# Altium schematic symbol library IC_TI.SCHLIB: 1162 symbols (part 3 of 8)
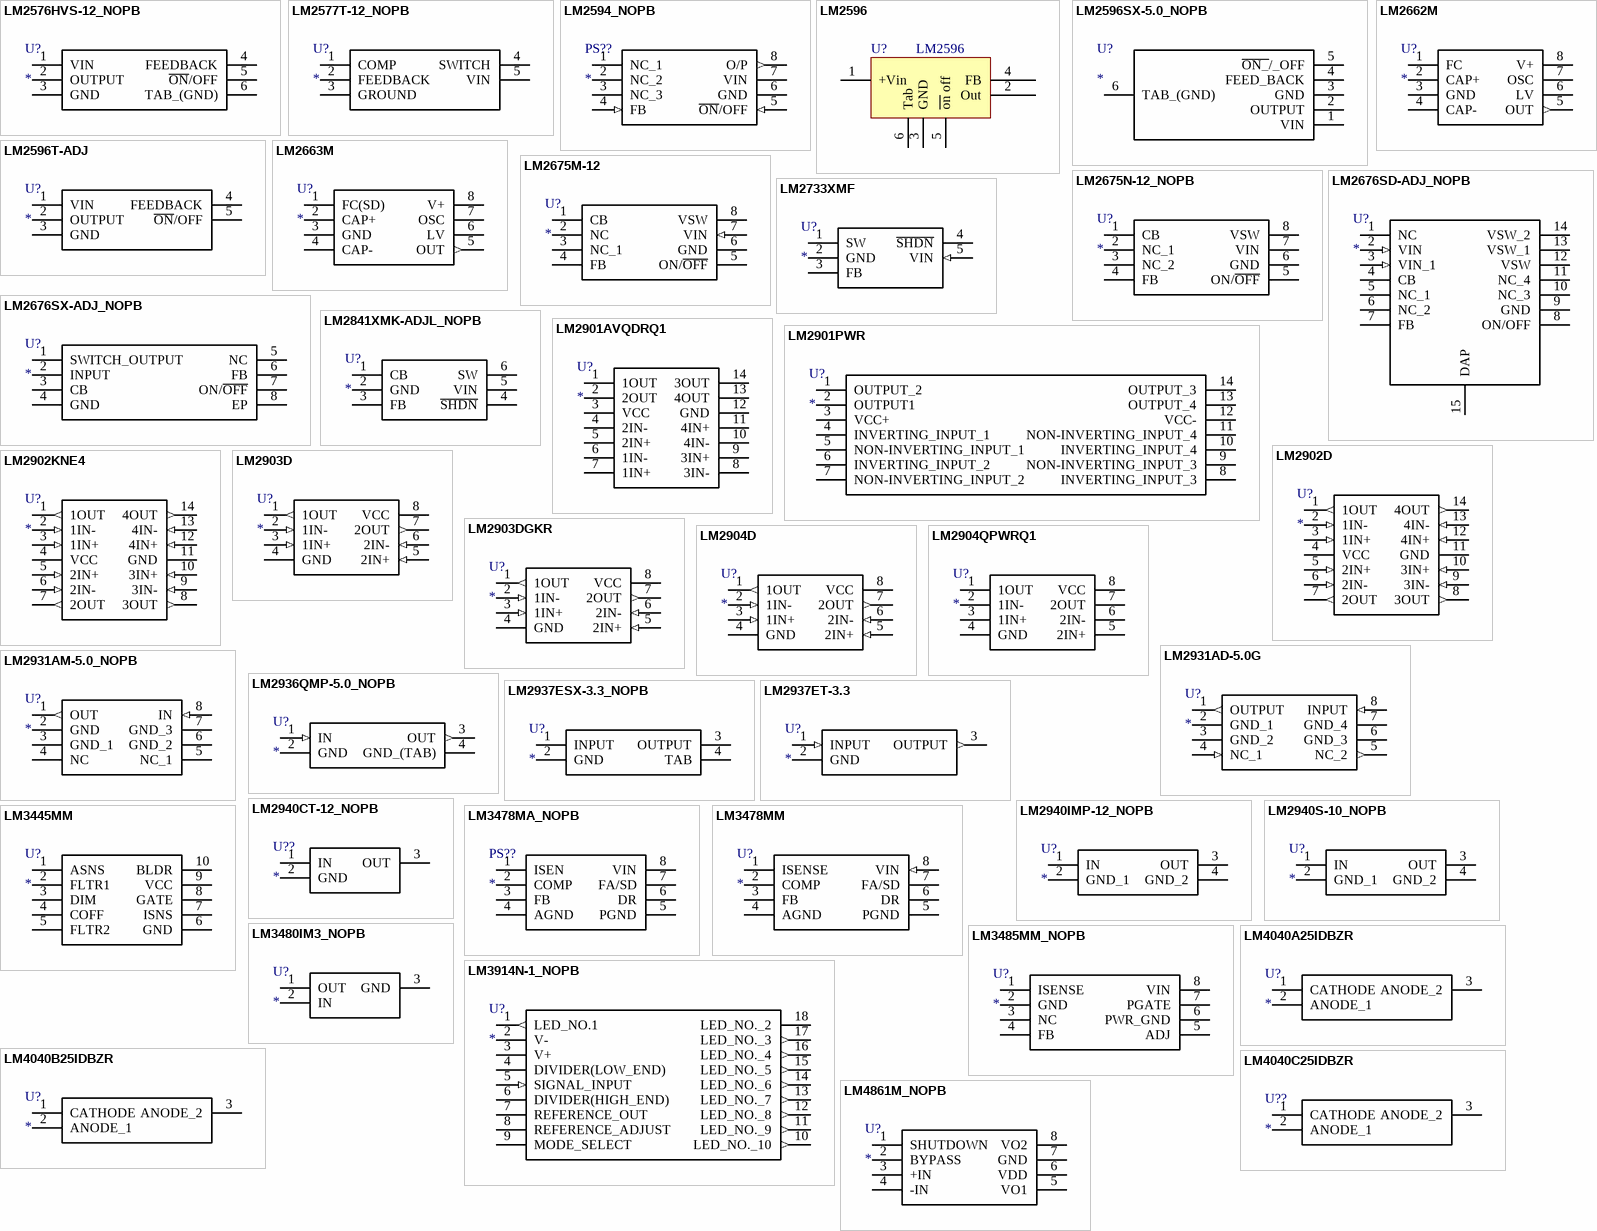
[diagram p37: symbols LM2576HVS-12_NOPB to LM4861M_NOPB]

## LM2902D
designator U?
Integrated Circuit; Manufacturer_Name: Texas Instruments; Manufacturer_Part_Number: LM2902D; Datasheet Link: http://www.ti.com/lit/ds/symlink/lm2902.pdf; Height: 1.75mm; Mouser Part Number: 595-LM2902D; Mouser Price/Stock: https://www.mouser.com/Search/Refine.aspx?Keyword=595-LM2902D; RS Part Number: 1450086; RS Price/Stock: http://uk.rs-online.com/web/p/products/1450086
footprint SOIC14_1.27
pins: 1 1OUT (out), 2 1IN- (in), 3 1IN+ (in), 4 VCC (power), 5 2IN+ (in), 6 2IN- (in), 7 2OUT (out), 8 3OUT (out), 9 3IN- (in), 10 3IN+ (in), 11 GND (power), 12 4IN+ (in), 13 4IN- (in), 14 4OUT (out)

## LM2902KNE4
designator U?
Integrated Circuit; Manufacturer_Name: Texas Instruments; Manufacturer_Part_Number: LM2902KNE4; Datasheet Link: http://www.ti.com/lit/ds/symlink/lm224.pdf; Height: 5.08mm; RS Part Number: 7320982; RS Price/Stock: http://uk.rs-online.com/web/p/products/7320982
footprint DIP14-A
pins: 1 1OUT (out), 2 1IN- (in), 3 1IN+ (in), 4 VCC (power), 5 2IN+ (in), 6 2IN- (in), 7 2OUT (out), 8 3OUT (out), 9 3IN- (in), 10 3IN+ (in), 11 GND (power), 12 4IN+ (in), 13 4IN- (in), 14 4OUT (out)

## LM2903D
designator U?
Integrated Circuit; Manufacturer_Name: Texas Instruments; Manufacturer_Part_Number: LM2903D; Datasheet Link: http://www.ti.com/lit/ds/symlink/lm2903.pdf; Height: 1.75mm; Mouser Part Number: 595-LM2903D; Mouser Price/Stock: https://www.mouser.com/Search/Refine.aspx?Keyword=595-LM2903D; RS Part Number: 6612794P; RS Price/Stock: http://uk.rs-online.com/web/p/products/6612794P
footprint SOIC8_1.27 (SOP, 8-Leads, Pitch 1.27mm)
pins: 1 1OUT (out), 2 1IN- (in), 3 1IN+ (in), 4 GND (power), 5 2IN+ (in), 6 2IN- (in), 7 2OUT (out), 8 VCC (power)

## LM2903DGKR
designator U?
Integrated Circuit; Manufacturer_Name: Texas Instruments; Manufacturer_Part_Number: LM2903DGKR; Datasheet Link: http://www.ti.com/lit/ds/symlink/lm393.pdf; Height: 1.1mm; Mouser Part Number: 595-LM2903DGKR; Mouser Price/Stock: https://www.mouser.com/Search/Refine.aspx?Keyword=595-LM2903DGKR; RS Part Number: 1625376; RS Price/Stock: http://uk.rs-online.com/web/p/products/1625376
footprint VSSOP8_0.65-PAD
pins: 1 1OUT (out), 2 1IN- (in), 3 1IN+ (in), 4 GND (power), 5 2IN+ (in), 6 2IN- (in), 7 2OUT (out), 8 VCC (power)

## LM2904D
designator U?
Integrated Circuit; Manufacturer_Name: Texas Instruments; Manufacturer_Part_Number: LM2904D; Datasheet Link: http://www.ti.com/lit/ds/symlink/lm2904.pdf; Height: 1.75mm; Mouser Part Number: 595-LM2904D; Mouser Price/Stock: https://www.mouser.com/Search/Refine.aspx?Keyword=595-LM2904D; RS Part Number: 1450108; RS Price/Stock: http://uk.rs-online.com/web/p/products/1450108
footprint SOIC8_1.27 (SOP, 8-Leads, Pitch 1.27mm)
pins: 1 1OUT (out), 2 1IN- (in), 3 1IN+ (in), 4 GND (power), 5 2IN+ (in), 6 2IN- (in), 7 2OUT (out), 8 VCC (power)

## LM2904QPWRQ1
designator U?
Integrated Circuit; Manufacturer_Name: Texas Instruments; Manufacturer_Part_Number: LM2904QPWRQ1; Datasheet Link: http://www.mouser.com/ds/2/405/lm2904-q1-557148.pdf; Height: 1.2mm; Mouser Part Number: 595-LM2904QPWRQ1; Mouser Price/Stock: https://www.mouser.com/Search/Refine.aspx?Keyword=595-LM2904QPWRQ1
footprint TSSOP8_0.65
pins: 1 1OUT, 2 1IN-, 3 1IN+, 4 GND, 5 2IN+, 6 2IN-, 7 2OUT, 8 VCC

## LM2931AD-5.0G
designator U?
Integrated Circuit; Manufacturer_Name: ON Semiconductor; Manufacturer_Part_Number: LM2931AD-5.0G; Allied_Number: 70100430; Datasheet Link: http://www.onsemi.com/pub/Collateral/LM2931-D.PDF; Height: 1.75mm; Mouser Part Number: 863-LM2931AD-5.0G; Mouser Price/Stock: https://www.mouser.com/Search/Refine.aspx?Keyword=863-LM2931AD-5.0G; RS Part Number: 0463470P; RS Price/Stock: http://uk.rs-online.com/web/p/products/0463470P; Allied Price/Stock: http://www.alliedelec.com/on-semiconductor-lm2931ad-5-0g/70100430/
footprint SOIC8_1.27 (SOP, 8-Leads, Pitch 1.27mm)
pins: 1 OUTPUT (out), 2 GND_1 (power), 3 GND_2 (power), 4 NC_1 (in), 5 NC_2 (out), 6 GND_3 (power), 7 GND_4 (power), 8 INPUT (in)

## LM2931AM-5.0_NOPB
designator U?
Integrated Circuit; Manufacturer_Name: Texas Instruments; Manufacturer_Part_Number: LM2931AM-5.0/NOPB; Datasheet Link: http://www.ti.com/lit/ds/symlink/lm2931-n.pdf; Height: 1.75mm; Mouser Part Number: 926-LM2931AM-5.0NOPB; Mouser Price/Stock: https://www.mouser.com/Search/Refine.aspx?Keyword=926-LM2931AM-5.0NOPB; RS Part Number: 0460869; RS Price/Stock: http://au.rs-online.com/web/p/products/0460869
footprint SOIC8_1.27 (SOP, 8-Leads, Pitch 1.27mm)
pins: 1 OUT (out), 2 GND (power), 3 GND_1 (power), 4 NC, 5 NC_1, 6 GND_2 (power), 7 GND_3 (power), 8 IN (in)

## LM2936QMP-5.0_NOPB
designator U?
Integrated Circuit; Manufacturer_Name: Texas Instruments; Manufacturer_Part_Number: LM2936QMP-5.0/NOPB; Datasheet Link: http://www.ti.com/general/docs/lit/getliterature.tsp?genericPartNumber=lm2936q-q1&fileType=pdf; Height: 1.8mm; Mouser Part Number: 595-LM2936QMP-5.0NPB; Mouser Price/Stock: https://www.mouser.com/Search/Refine.aspx?Keyword=595-LM2936QMP-5.0NPB
footprint SOT223
pins: 1 IN (in), 2 GND (power), 3 OUT (out), 4 GND_(TAB) (power)

## LM2937ESX-3.3_NOPB
designator U?
Integrated Circuit; Manufacturer_Name: Texas Instruments; Manufacturer_Part_Number: LM2937ESX-3.3/NOPB; Datasheet Link: http://www.ti.com/lit/gpn/lm2937-3.3; Mouser Part Number: 926-LM2937ESX33NOPB; Mouser Price/Stock: https://www.mouser.com/Search/Refine.aspx?Keyword=926-LM2937ESX33NOPB
footprint TO263-3
pins: 1 INPUT, 2 GND, 3 OUTPUT, 4 TAB

## LM2937ET-3.3
designator U?
Integrated Circuit; Manufacturer_Name: Texas Instruments; Manufacturer_Part_Number: LM2937ET-3.3; Datasheet Link: https://componentsearchengine.com/Datasheets/2/LM2937ET-3.3.pdf; Height: 4.7mm; Mouser Part Number: 926-LM2937ET-33; Mouser Price/Stock: https://www.mouser.com/Search/Refine.aspx?Keyword=926-LM2937ET-33; RS Part Number: 4713766; RS Price/Stock: http://uk.rs-online.com/web/p/products/4713766
footprint TO220-3
pins: 1 INPUT (in), 2 GND (power), 3 OUTPUT (out)

## LM2940CT-12_NOPB
designator U??
Undefined or Miscellaneous; Manufacturer_Name: Texas Instruments; Manufacturer_Part_Number: LM2940CT-12/NOPB; Datasheet Link: http://www.ti.com/lit/gpn/lm2940c; Height: 4.7mm; Mouser Part Number: 926-LM2940CT-12/NOPB; Mouser Price/Stock: https://www.mouser.com/Search/Refine.aspx?Keyword=926-LM2940CT-12%2FNOPB; RS Part Number: 5359290; RS Price/Stock: http://uk.rs-online.com/web/p/products/5359290
footprint TO220-3
pins: 1 IN, 2 GND, 3 OUT

## LM2940IMP-12_NOPB
designator U?
Integrated Circuit; Manufacturer_Name: Texas Instruments; Manufacturer_Part_Number: LM2940IMP-12/NOPB; Datasheet Link: http://www.mouser.com/ds/2/405/lm2940-n-405274.pdf; Height: 1.8mm; Mouser Part Number: 926-LM2940IMP-12NOPB; Mouser Price/Stock: https://www.mouser.com/Search/Refine.aspx?Keyword=926-LM2940IMP-12NOPB; RS Part Number: 7614609P; RS Price/Stock: http://uk.rs-online.com/web/p/products/7614609P
footprint SOT223
pins: 1 IN, 2 GND_1, 3 OUT, 4 GND_2

## LM2940S-10_NOPB
designator U?
Integrated Circuit; Manufacturer_Name: Texas Instruments; Manufacturer_Part_Number: LM2940S-10/NOPB; Datasheet Link: http://www.ti.com/lit/gpn/lm2940-n; Mouser Part Number: 926-LM2940S-10/NOPB; Mouser Price/Stock: https://www.mouser.com/Search/Refine.aspx?Keyword=926-LM2940S-10%2FNOPB; RS Part Number: 1451304; RS Price/Stock: http://uk.rs-online.com/web/p/products/1451304
footprint TO263-3
pins: 1 IN, 2 GND_1, 3 OUT, 4 GND_2

## LM3445MM
designator U?
Integrated Circuit; Manufacturer_Name: Texas Instruments; Manufacturer_Part_Number: LM3445MM
footprint VSSOP10_0.5
pins: 1 ASNS, 2 FLTR1, 3 DIM, 4 COFF, 5 FLTR2, 6 GND, 7 ISNS, 8 GATE, 9 VCC, 10 BLDR

## LM3478MA_NOPB
designator PS??
Power Supply; Manufacturer_Name: Texas Instruments; Manufacturer_Part_Number: LM3478MA/NOPB; Datasheet Link: http://www.ti.com/lit/gpn/lm3478; Height: 1.75mm; Mouser Part Number: 926-LM3478MA/NOPB; Mouser Price/Stock: https://www.mouser.com/Search/Refine.aspx?Keyword=926-LM3478MA%2FNOPB; RS Part Number: 8115560P; RS Price/Stock: http://uk.rs-online.com/web/p/products/8115560P
footprint SOIC8_1.27 (SOP, 8-Leads, Pitch 1.27mm)
pins: 1 ISEN, 2 COMP, 3 FB, 4 AGND, 5 PGND, 6 DR, 7 FA/SD, 8 VIN

## LM3478MM
designator U?
Integrated Circuit; Manufacturer_Name: Texas Instruments; Manufacturer_Part_Number: LM3478MM; Datasheet Link: http://www.ti.com/lit/ds/symlink/lm3478.pdf; Height: 1.1mm; Mouser Part Number: 926-LM3478MM; Mouser Price/Stock: https://www.mouser.com/Search/Refine.aspx?Keyword=926-LM3478MM; RS Part Number: 4713930; RS Price/Stock: http://uk.rs-online.com/web/p/products/4713930
footprint VSSOP8_0.65-PAD
pins: 1 ISENSE, 2 COMP, 3 FB, 4 AGND (power), 5 PGND (power), 6 DR, 7 FA/SD, 8 VIN (in)

## LM3480IM3_NOPB
designator U?
Integrated Circuit; Manufacturer_Name: Texas Instruments; Manufacturer_Part_Number: LM3480IM3-5.0/NOPB; Datasheet Link: http://www.ti.com/lit/gpn/lm3480; Height: 0.95mm; Mouser Part Number: 926-LM3480IM35.0NOPB; Mouser Price/Stock: https://www.mouser.com/Search/Refine.aspx?Keyword=926-LM3480IM35.0NOPB; RS Part Number: 5045115P; RS Price/Stock: http://uk.rs-online.com/web/p/products/5045115P
footprint SOT23-3 (贴片MOS的SOT-23封装)
pins: 1 OUT, 2 IN, 3 GND

## LM3485MM_NOPB
designator U?
Integrated Circuit; Manufacturer_Name: Texas Instruments; Manufacturer_Part_Number: LM3485MM/NOPB; Datasheet Link: http://www.ti.com/lit/ds/symlink/lm3485.pdf; Height: 1.1mm; Mouser Part Number: 926-LM3485MM/NOPB; Mouser Price/Stock: https://www.mouser.com/Search/Refine.aspx?Keyword=926-LM3485MM%2FNOPB; RS Part Number: 5359391P; RS Price/Stock: http://uk.rs-online.com/web/p/products/5359391P
footprint VSSOP8_0.65-PAD
pins: 1 ISENSE, 2 GND, 3 NC, 4 FB, 5 ADJ, 6 PWR_GND, 7 PGATE, 8 VIN

## LM3914N-1_NOPB
designator U?
Integrated Circuit; Manufacturer_Name: Texas Instruments; Manufacturer_Part_Number: LM3914N-1/NOPB; Datasheet Link: https://componentsearchengine.com/Datasheets/2/LM3914N-1_NOPB.pdf; Height: 5.334mm; Mouser Part Number: 926-LM3914N-1/NOPB; Mouser Price/Stock: https://www.mouser.com/Search/Refine.aspx?Keyword=926-LM3914N-1%2FNOPB; RS Part Number: 5342977A; RS Price/Stock: http://uk.rs-online.com/web/p/products/5342977A
footprint DIP18-A
pins: 1 LED_NO.1 (out), 2 V- (power), 3 V+ (power), 4 DIVIDER(LOW_END), 5 SIGNAL_INPUT (in), 6 DIVIDER(HIGH_END), 7 REFERENCE_OUT, 8 REFERENCE_ADJUST, 9 MODE_SELECT, 10 LED_NO._10 (out), 11 LED_NO._9 (out), 12 LED_NO._8 (out), 13 LED_NO._7 (out), 14 LED_NO._6 (out), 15 LED_NO._5 (out), 16 LED_NO._4 (out), 17 LED_NO._3 (out), 18 LED_NO._2

## LM4040A25IDBZR
designator U?
Integrated Circuit; Manufacturer_Name: Texas Instruments; Manufacturer_Part_Number: LM4040A25IDBZR; Datasheet Link: http://www.ti.com/lit/ds/symlink/lm4040.pdf; Height: 0.95mm; Mouser Part Number: 595-LM4040A25IDBZR; Mouser Price/Stock: https://www.mouser.com/Search/Refine.aspx?Keyword=595-LM4040A25IDBZR
footprint SOT23-3 (贴片MOS的SOT-23封装)
pins: 1 CATHODE, 2 ANODE_1, 3 ANODE_2

## LM4040B25IDBZR
designator U?
Integrated Circuit; Manufacturer_Name: Texas Instruments; Manufacturer_Part_Number: LM4040B25IDBZR; Datasheet Link: http://www.ti.com/lit/gpn/lm4040; Height: 0.95mm; Mouser Part Number: 595-LM4040B25IDBZR; Mouser Price/Stock: https://www.mouser.com/Search/Refine.aspx?Keyword=595-LM4040B25IDBZR; RS Part Number: 1625820; RS Price/Stock: http://uk.rs-online.com/web/p/products/1625820
footprint SOT23-3 (贴片MOS的SOT-23封装)
pins: 1 CATHODE, 2 ANODE_1, 3 ANODE_2

## LM4040C25IDBZR
designator U??
Undefined or Miscellaneous; Manufacturer_Name: Texas Instruments; Manufacturer_Part_Number: LM4040C25IDBZR; Datasheet Link: http://www.ti.com/general/docs/lit/getliterature.tsp?genericPartNumber=LM4040C25&&fileType=pdf; Height: 1.12mm; Mouser Part Number: 595-LM4040C25IDBZR; Mouser Price/Stock: https://www.mouser.com/Search/Refine.aspx?Keyword=595-LM4040C25IDBZR
footprint SOT23-3 (贴片MOS的SOT-23封装)
pins: 1 CATHODE, 2 ANODE_1, 3 ANODE_2

## LM4861M_NOPB
designator U?
Integrated Circuit; Manufacturer_Name: Texas Instruments; Manufacturer_Part_Number: LM4861M/NOPB; Datasheet Link: http://www.ti.com/lit/ds/symlink/lm4861.pdf; Height: 1.75mm; Mouser Part Number: 926-LM4861M/NOPB; Mouser Price/Stock: https://www.mouser.com/Search/Refine.aspx?Keyword=926-LM4861M%2FNOPB; RS Part Number: 5343374P; RS Price/Stock: http://uk.rs-online.com/web/p/products/5343374P
footprint SOIC8_1.27 (SOP, 8-Leads, Pitch 1.27mm)
pins: 1 SHUTDOWN, 2 BYPASS, 3 +IN, 4 -IN, 5 VO1, 6 VDD, 7 GND, 8 VO2

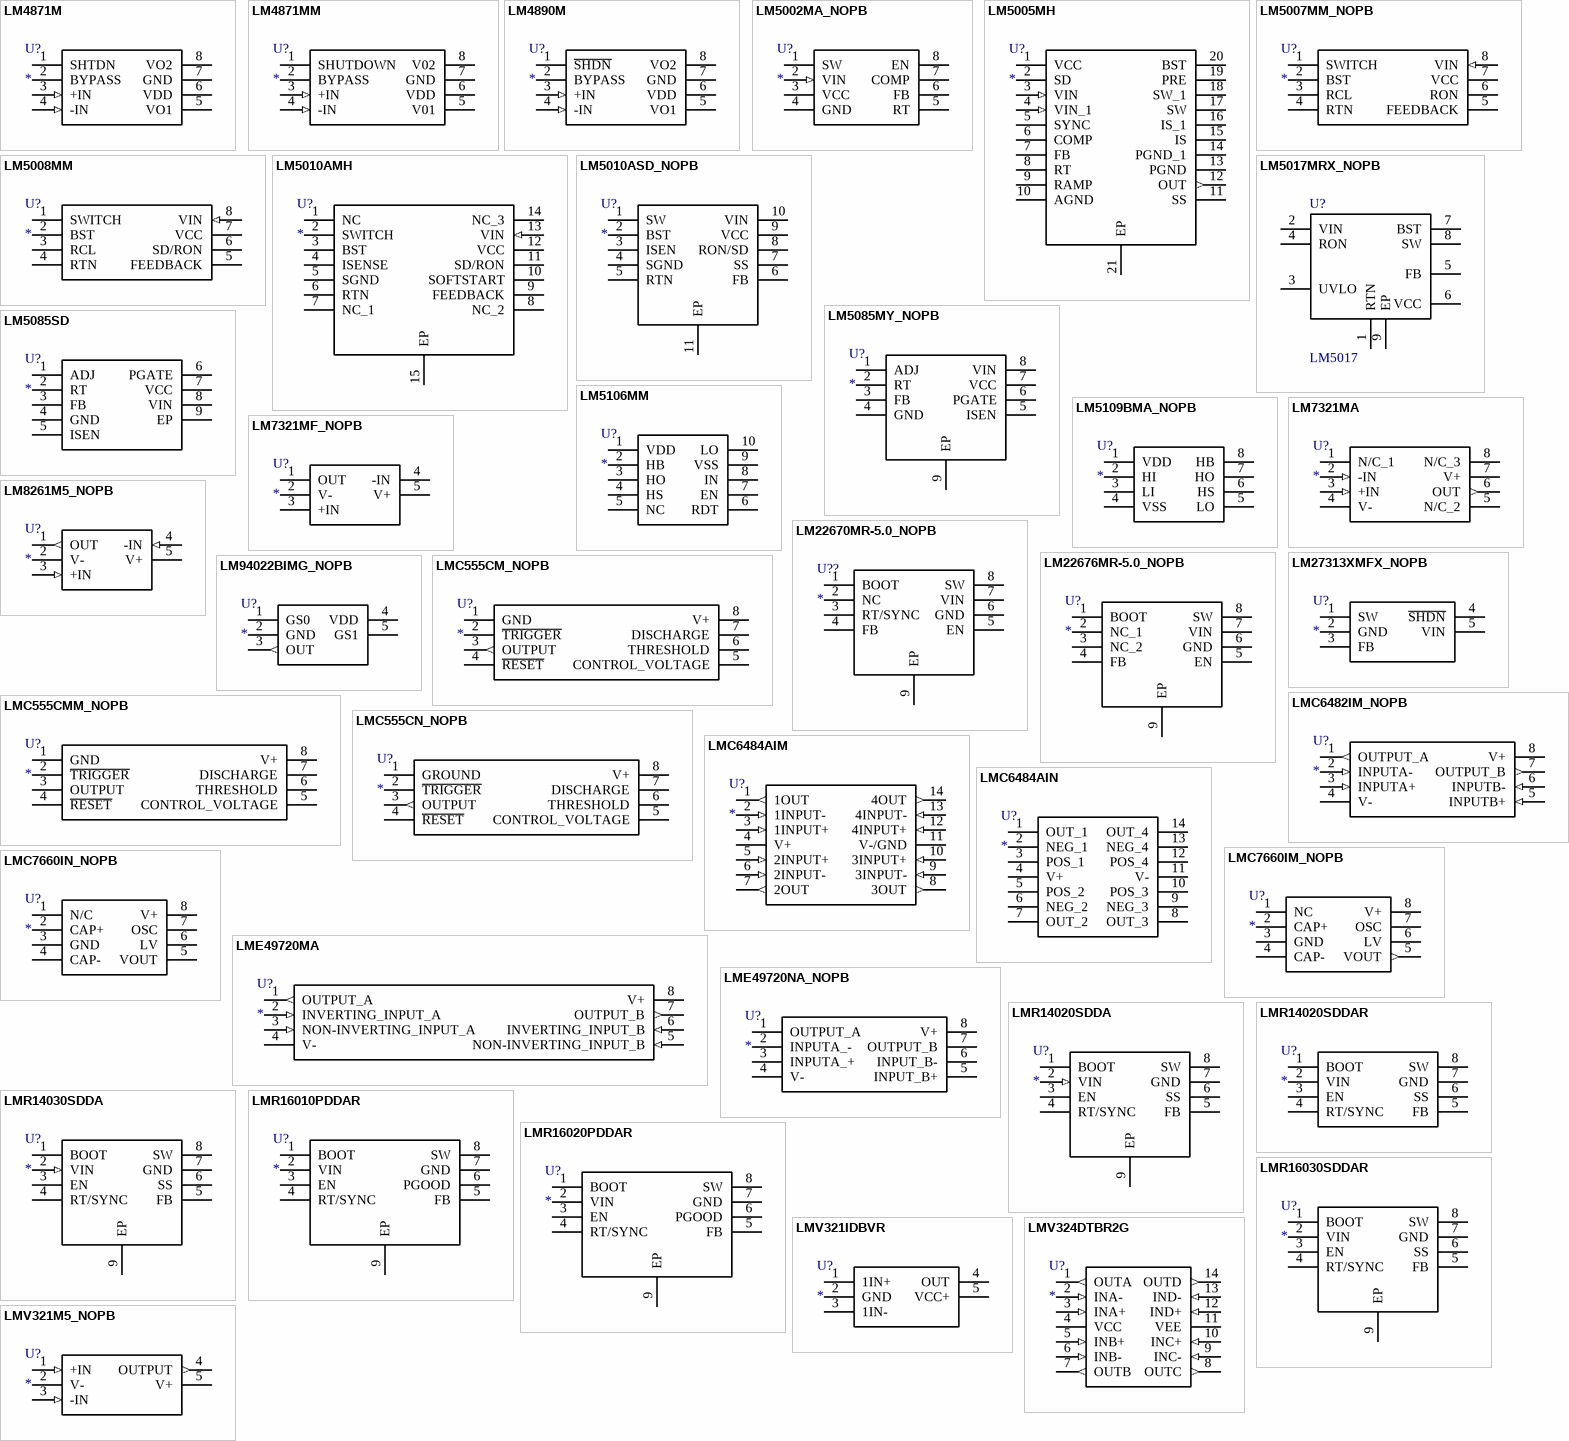
[diagram p10: symbols LM4871M to LMV324DTBR2G]

## LM4871M
designator U?
Integrated Circuit; Manufacturer_Name: Texas Instruments; Manufacturer_Part_Number: LM4871M; Datasheet Link: http://www.ti.com/lit/ds/symlink/lm4871.pdf; Height: 1.75mm; Mouser Part Number: 926-LM4871M; Mouser Price/Stock: https://www.mouser.com/Search/Refine.aspx?Keyword=926-LM4871M; RS Part Number: 3071869
footprint SOIC8_1.27 (SOP, 8-Leads, Pitch 1.27mm)
pins: 1 SHTDN, 2 BYPASS, 3 +IN (in), 4 -IN (in), 5 VO1, 6 VDD (power), 7 GND (power), 8 VO2

## LM4871MM
designator U?
Integrated Circuit; Manufacturer_Name: Texas Instruments; Manufacturer_Part_Number: LM4871MM; Datasheet Link: http://www.ti.com/lit/ds/symlink/lm4871.pdf; Height: 1.1mm; Mouser Part Number: 926-LM4871MM; Mouser Price/Stock: https://www.mouser.com/Search/Refine.aspx?Keyword=926-LM4871MM; RS Part Number: 6416439
footprint VSSOP8_0.65-PAD
pins: 1 SHUTDOWN, 2 BYPASS, 3 +IN (in), 4 -IN (in), 5 V01, 6 VDD (power), 7 GND (power), 8 V02

## LM4890M
designator U?
Integrated Circuit; Manufacturer_Name: Texas Instruments; Manufacturer_Part_Number: LM4890M; Datasheet Link: http://www.ti.com/lit/ds/symlink/lm4890.pdf; Height: 1.75mm; Mouser Part Number: 926-LM4890M; Mouser Price/Stock: https://www.mouser.com/Search/Refine.aspx?Keyword=926-LM4890M; RS Part Number: 4146330
footprint SOIC8_1.27 (SOP, 8-Leads, Pitch 1.27mm)
pins: 1 ~{SHDN}, 2 BYPASS, 3 +IN (in), 4 -IN (in), 5 VO1, 6 VDD (power), 7 GND (power), 8 VO2

## LM5002MA_NOPB
designator U?
Integrated Circuit; Manufacturer_Name: Texas Instruments; Manufacturer_Part_Number: LM5002MA/NOPB; Datasheet Link: http://www.ti.com/lit/ds/symlink/lm5002.pdf; Height: 1.75mm; Mouser Part Number: 926-LM5002MA/NOPB; Mouser Price/Stock: https://www.mouser.com/Search/Refine.aspx?Keyword=926-LM5002MA%2FNOPB; RS Part Number: 0181332P; RS Price/Stock: http://uk.rs-online.com/web/p/products/0181332P
footprint SOIC8_1.27 (SOP, 8-Leads, Pitch 1.27mm)
pins: 1 SW, 2 VIN (in), 3 VCC (power), 4 GND (power), 5 RT, 6 FB, 7 COMP, 8 EN

## LM5005MH
designator U?
Integrated Circuit; Manufacturer_Name: Texas Instruments; Manufacturer_Part_Number: LM5005MH; Datasheet Link: http://www.ti.com/lit/ds/symlink/lm5005.pdf; Height: 1.1mm; Mouser Part Number: 926-LM5005MH; Mouser Price/Stock: https://www.mouser.com/Search/Refine.aspx?Keyword=926-LM5005MH
footprint TSSOP20_0.65-PAD (TSOP, 20-Leads, Body 6.6x4.5mm (max), Pitch 0.65mm, IPC Medium Density)
pins: 1 VCC (power), 2 SD, 3 VIN (in), 4 VIN_1 (in), 5 SYNC, 6 COMP, 7 FB, 8 RT, 9 RAMP, 10 AGND (power), 11 SS, 12 OUT (out), 13 PGND (power), 14 PGND_1 (power), 15 IS, 16 IS_1, 17 SW, 18 SW_1, 19 PRE, 20 BST, 21 EP

## LM5007MM_NOPB
designator U?
Integrated Circuit; Manufacturer_Name: Texas Instruments; Manufacturer_Part_Number: LM5007MM/NOPB; Datasheet Link: http://www.ti.com/lit/ds/symlink/lm5007.pdf; Height: 1.1mm; Mouser Part Number: 926-LM5007MM/NOPB; Mouser Price/Stock: https://www.mouser.com/Search/Refine.aspx?Keyword=926-LM5007MM%2FNOPB; RS Part Number: 5343431P; RS Price/Stock: http://uk.rs-online.com/web/p/products/5343431P
footprint VSSOP8_0.65-PAD
pins: 1 SWITCH, 2 BST, 3 RCL, 4 RTN, 5 FEEDBACK, 6 RON, 7 VCC (power), 8 VIN (in)

## LM5008MM
designator U?
Integrated Circuit; Manufacturer_Name: Texas Instruments; Manufacturer_Part_Number: LM5008MM; Datasheet Link: http://www.ti.com/lit/ds/symlink/lm5008.pdf; Height: 1.1mm; Mouser Part Number: 926-LM5008MM; Mouser Price/Stock: https://www.mouser.com/Search/Refine.aspx?Keyword=926-LM5008MM
footprint VSSOP8_0.65-PAD
pins: 1 SWITCH, 2 BST, 3 RCL, 4 RTN, 5 FEEDBACK, 6 SD/RON, 7 VCC (power), 8 VIN (in)

## LM5010AMH
designator U?
Integrated Circuit; Manufacturer_Name: Texas Instruments; Manufacturer_Part_Number: LM5010AMH; Datasheet Link: http://www.ti.com/lit/ds/symlink/lm5010a.pdf; Height: 1.1mm; Mouser Part Number: 926-LM5010AMH; Mouser Price/Stock: https://www.mouser.com/Search/Refine.aspx?Keyword=926-LM5010AMH; RS Part Number: 6553948P; RS Price/Stock: http://uk.rs-online.com/web/p/products/6553948P
footprint TSSOP14_0.65-PAD (TSOP, 14-Leads, Body 5.00x4.40mm, Pitch 0.65mm, Thermal Pad 2.31x2.46mm, IPC Low Density)
pins: 1 NC, 2 SWITCH, 3 BST, 4 ISENSE, 5 SGND (power), 6 RTN, 7 NC_1, 8 NC_2, 9 FEEDBACK, 10 SOFTSTART, 11 SD/RON, 12 VCC (power), 13 VIN (in), 14 NC_3, 15 EP

## LM5010ASD_NOPB
designator U?
Integrated Circuit; Manufacturer_Name: Texas Instruments; Manufacturer_Part_Number: LM5010ASD/NOPB; Datasheet Link: http://www.ti.com/lit/gpn/lm5010a; Height: 0.8mm; Mouser Part Number: 926-LM5010ASD/NOPB; Mouser Price/Stock: https://www.mouser.com/Search/Refine.aspx?Keyword=926-LM5010ASD%2FNOPB; RS Part Number: 9216756; RS Price/Stock: http://uk.rs-online.com/web/p/products/9216756
footprint DFN10_0.8-PAD(4X4)
pins: 1 SW, 2 BST, 3 ISEN, 4 SGND, 5 RTN, 6 FB, 7 SS, 8 RON/SD, 9 VCC, 10 VIN, 11 EP

## LM5017MRX_NOPB
designator U?, comment LM5017
Integrated Circuit; Manufacturer_Name: Texas Instruments; Manufacturer_Part_Number: LM5017MRX/NOPB; Datasheet Link: http://www.ti.com/lit/ds/symlink/lm5017.pdf; Height: 1.68mm; Mouser Part Number: 926-LM5017MRX/NOPB; Mouser Price/Stock: https://www.mouser.com/Search/Refine.aspx?Keyword=926-LM5017MRX%2FNOPB
footprint SOIC8_1.27-PAD
pins: 1 RTN, 2 VIN, 3 UVLO, 4 RON, 5 FB, 6 VCC, 7 BST, 8 SW, 9 EP

## LM5085MY_NOPB
designator U?
Integrated Circuit; Manufacturer_Name: Texas Instruments; Manufacturer_Part_Number: LM5085MY/NOPB; Datasheet Link: http://www.ti.com/lit/gpn/lm5085; Height: 1.09mm; Mouser Part Number: 926-LM5085MY/NOPB; Mouser Price/Stock: https://www.mouser.com/Search/Refine.aspx?Keyword=926-LM5085MY%2FNOPB; RS Part Number: 1627709; RS Price/Stock: http://uk.rs-online.com/web/p/products/1627709
footprint VSSOP8_0.65-PAD
pins: 1 ADJ, 2 RT, 3 FB, 4 GND, 5 ISEN, 6 PGATE, 7 VCC, 8 VIN, 9 EP

## LM5085SD
designator U?
Integrated Circuit; Manufacturer_Name: Texas Instruments; Manufacturer_Part_Number: LM5085SD
footprint DFN8_0.5-PAD(3X3)
pins: 1 ADJ, 2 RT, 3 FB, 4 GND, 5 ISEN, 6 PGATE, 7 VCC, 8 VIN, 9 EP

## LM5106MM
designator U?
Integrated Circuit; Manufacturer_Name: Texas Instruments; Manufacturer_Part_Number: LM5106MM; Mouser Part Number: 926-LM5106MM; Mouser Price/Stock: https://www.mouser.com/Search/Refine.aspx?Keyword=926-LM5106MM
footprint VSSOP10_0.5
pins: 1 VDD, 2 HB, 3 HO, 4 HS, 5 NC, 6 RDT, 7 EN, 8 IN, 9 VSS, 10 LO
